# Altium footprint library Pcb.PcbLib: 33 footprints (part 1 of 3)
Each footprint in its own frame and in the unit in brackets; x right, y up, seen from the top. Pads: shape width x height; smd on the part's side, far side on the other; paste and mask are expansions set on the pad; w line width, h text height; cw(c..) or ccw(c..) is an arc to the next point about the centre after c.
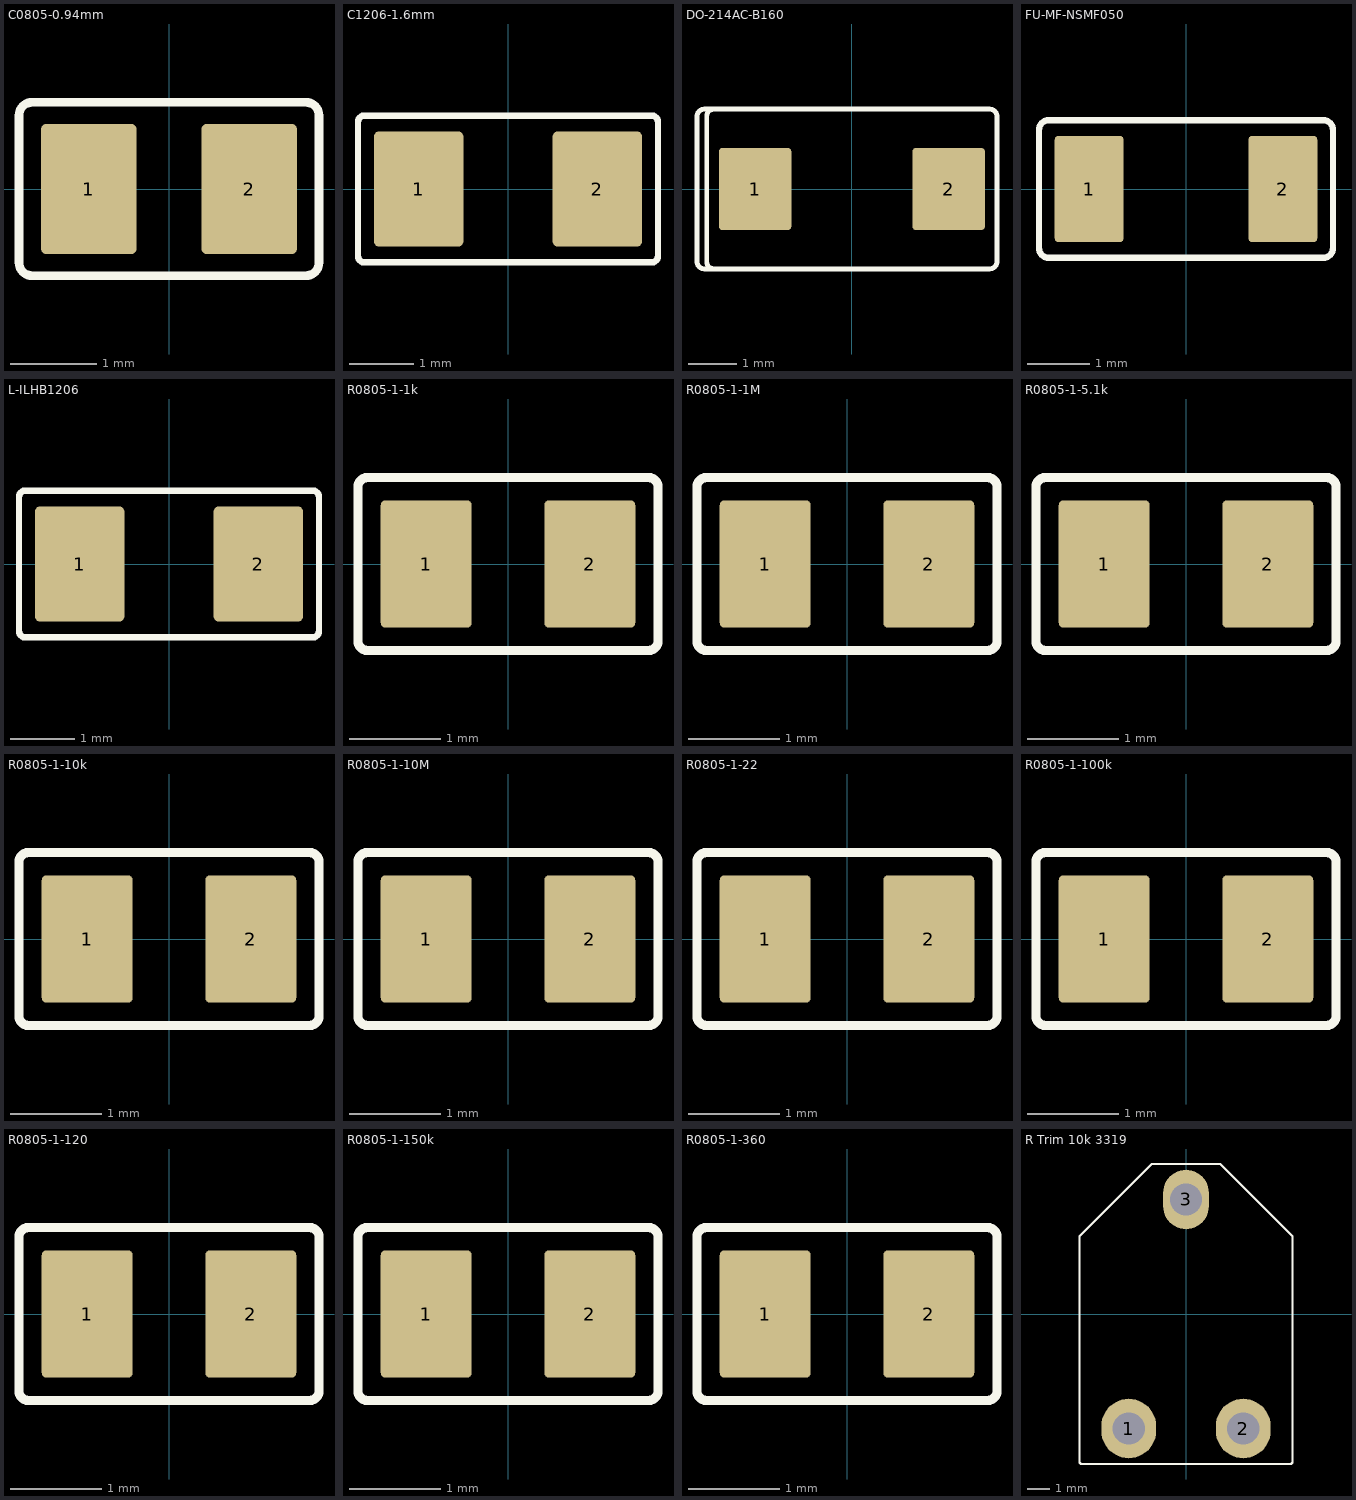
[diagram p0: the footprints below, top view; thin cyan lines are the x and y axes]

## C0805-0.94mm [mm] "Chip Capacitor, IPC Medium Density"
height 0.94
pads (2):
  rrect10% 1.1x1.5 smd: 1(-0.925,0) 2(0.925,0)
Top Overlay:
  lines w0.1: -1.73,-0.85 ccw(c-1.58,-0.85) -1.58,-1 1.58,-1 ccw(c1.58,-0.85) 1.73,-0.85 1.73,0.85 ccw(c1.58,0.85) 1.58,1 -1.58,1 ccw(c-1.58,0.85) -1.73,0.85 -1.73,-0.85
3D body "C0805-0.94mm.SLDPRT": height 0.92, standoff -0.02, extent -1,-0.625 1,0.625

## C1206-1.6mm [mm] "Chip Capacitor, IPC Medium Density"
height 1.6
pads (2):
  rrect10% 1.4x1.8 smd: 1(-1.4,0) 2(1.4,0)
Top Overlay:
  lines w0.1: -2.35,-1.05 ccw(c-2.25,-1.05) -2.25,-1.15 2.25,-1.15 ccw(c2.25,-1.05) 2.35,-1.05 2.35,1.05 ccw(c2.25,1.05) 2.25,1.15 -2.25,1.15 ccw(c-2.25,1.05) -2.35,1.05 -2.35,-1.05
3D body "C1206-1.6mm.SLDPRT": height 1.58, standoff -0.02, extent -1.6,-0.8 1.6,0.8

## DO-214AC-B160 [mm] "Molded Diode, IPC Medium Density"
height 2.29
pads (2):
  rrect10% 1.5x1.7 smd: 1(-2,0) 2(2,0)
Top Overlay:
  lines w0.1: -2.85,-1.65 cw(c-2.85,-1.5) -3,-1.5 -3,1.5 cw(c-2.85,1.5) -2.85,1.65 ; -3.2,-1.5 ccw(c-3.05,-1.5) -3.05,-1.65 2.85,-1.65 ccw(c2.85,-1.5) 3,-1.5 3,1.5 ccw(c2.85,1.5) 2.85,1.65 -3.05,1.65 ccw(c-3.05,1.5) -3.2,1.5 -3.2,-1.5
3D body "DO-214AC-B160.STEP": height 2.91, standoff 0, extent -2.8,-1.475 2.8,1.475

## FU-MF-NSMF050 [mm] "Chip Fuse"
height 0.65
pads (2):
  rrect10% 1.1x1.7 smd: 1(-1.55,0) 2(1.55,0)
Top Overlay:
  lines w0.1: -2.35,-0.95 ccw(c-2.2,-0.95) -2.2,-1.1 2.2,-1.1 ccw(c2.2,-0.95) 2.35,-0.95 2.35,0.95 ccw(c2.2,0.95) 2.2,1.1 -2.2,1.1 ccw(c-2.2,0.95) -2.35,0.95 -2.35,-0.95
3D body "FU-MF-NSMF050.SLDPRT": height 0.54, standoff -0.02, extent -1.6,-0.8 1.6,0.8

## L-ILHB1206 [mm] "Chip Ferrite Bead, IPC Medium Density"
height 1.1
pads (2):
  rrect10% 1.4x1.8 smd: 1(-1.4,0) 2(1.4,0)
Top Overlay:
  lines w0.1: -2.35,-1.05 ccw(c-2.25,-1.05) -2.25,-1.15 2.25,-1.15 ccw(c2.25,-1.05) 2.35,-1.05 2.35,1.05 ccw(c2.25,1.05) 2.25,1.15 -2.25,1.15 ccw(c-2.25,1.05) -2.35,1.05 -2.35,-1.05
3D body "L-ILHB1206.SLDPRT": height 1.08, standoff -0.02, extent -1.6,-0.8 1.6,0.8

## R0805-1-1k [mm] "Yageo general purpose chip resistor, IPC Medium Density"
height 0.6
pads (2):
  rrect10% 1x1.4 smd: 1(-0.9,0) 2(0.9,0)
Top Overlay:
  lines w0.1: -1.65,-0.85 ccw(c-1.55,-0.85) -1.55,-0.95 1.55,-0.95 ccw(c1.55,-0.85) 1.65,-0.85 1.65,0.85 ccw(c1.55,0.85) 1.55,0.95 -1.55,0.95 ccw(c-1.55,0.85) -1.65,0.85 -1.65,-0.85
Mechanical 1:
  lines w0.01: -1,-0.5 -1,-0.625 -0.875,-0.625 ; -1,0.5 -1,0.625 -0.875,0.625 ; 0.875,-0.625 1,-0.625 1,-0.5 ; 0.875,0.625 1,0.625 1,0.5
3D body "R0805-1-1k.SLDPRT": height 0.49, standoff -0.03, extent -1,-0.625 1,0.625

## R0805-1-1M [mm] "Yageo general purpose chip resistor, IPC Medium Density"
height 0.6
pads (2):
  rrect10% 1x1.4 smd: 1(-0.9,0) 2(0.9,0)
Top Overlay:
  lines w0.1: -1.65,-0.85 ccw(c-1.55,-0.85) -1.55,-0.95 1.55,-0.95 ccw(c1.55,-0.85) 1.65,-0.85 1.65,0.85 ccw(c1.55,0.85) 1.55,0.95 -1.55,0.95 ccw(c-1.55,0.85) -1.65,0.85 -1.65,-0.85
Mechanical 1:
  lines w0.01: -1,-0.5 -1,-0.625 -0.875,-0.625 ; -1,0.5 -1,0.625 -0.875,0.625 ; 0.875,-0.625 1,-0.625 1,-0.5 ; 0.875,0.625 1,0.625 1,0.5
3D body "R0805-1-1M.SLDPRT": height 0.49, standoff -0.03, extent -1,-0.625 1,0.625

## R0805-1-5.1k [mm] "Yageo general purpose chip resistor, IPC Medium Density"
height 0.6
pads (2):
  rrect10% 1x1.4 smd: 1(-0.9,0) 2(0.9,0)
Top Overlay:
  lines w0.1: -1.65,-0.85 ccw(c-1.55,-0.85) -1.55,-0.95 1.55,-0.95 ccw(c1.55,-0.85) 1.65,-0.85 1.65,0.85 ccw(c1.55,0.85) 1.55,0.95 -1.55,0.95 ccw(c-1.55,0.85) -1.65,0.85 -1.65,-0.85
Mechanical 1:
  lines w0.01: -1,-0.5 -1,-0.625 -0.875,-0.625 ; -1,0.5 -1,0.625 -0.875,0.625 ; 0.875,-0.625 1,-0.625 1,-0.5 ; 0.875,0.625 1,0.625 1,0.5
3D body "R0805-1-5.1k.SLDPRT": height 0.49, standoff -0.03, extent -1,-0.625 1,0.625

## R0805-1-10k [mm] "Yageo general purpose chip resistor, IPC Medium Density"
height 0.6
pads (2):
  rrect10% 1x1.4 smd: 1(-0.9,0) 2(0.9,0)
Top Overlay:
  lines w0.1: -1.65,-0.85 ccw(c-1.55,-0.85) -1.55,-0.95 1.55,-0.95 ccw(c1.55,-0.85) 1.65,-0.85 1.65,0.85 ccw(c1.55,0.85) 1.55,0.95 -1.55,0.95 ccw(c-1.55,0.85) -1.65,0.85 -1.65,-0.85
Mechanical 1:
  lines w0.01: -1,-0.5 -1,-0.625 -0.875,-0.625 ; -1,0.5 -1,0.625 -0.875,0.625 ; 0.875,-0.625 1,-0.625 1,-0.5 ; 0.875,0.625 1,0.625 1,0.5
3D body "R0805-1-10k.SLDPRT": height 0.49, standoff -0.03, extent -1,-0.625 1,0.625

## R0805-1-10M [mm] "Yageo general purpose chip resistor, IPC Medium Density"
height 0.6
pads (2):
  rrect10% 1x1.4 smd: 1(-0.9,0) 2(0.9,0)
Top Overlay:
  lines w0.1: -1.65,-0.85 ccw(c-1.55,-0.85) -1.55,-0.95 1.55,-0.95 ccw(c1.55,-0.85) 1.65,-0.85 1.65,0.85 ccw(c1.55,0.85) 1.55,0.95 -1.55,0.95 ccw(c-1.55,0.85) -1.65,0.85 -1.65,-0.85
Mechanical 1:
  lines w0.01: -1,-0.5 -1,-0.625 -0.875,-0.625 ; -1,0.5 -1,0.625 -0.875,0.625 ; 0.875,-0.625 1,-0.625 1,-0.5 ; 0.875,0.625 1,0.625 1,0.5
3D body "R0805-1-10M.SLDPRT": height 0.49, standoff -0.03, extent -1,-0.625 1,0.625

## R0805-1-22 [mm] "Yageo general purpose chip resistor, IPC Medium Density"
height 0.6
pads (2):
  rrect10% 1x1.4 smd: 1(-0.9,0) 2(0.9,0)
Top Overlay:
  lines w0.1: -1.65,-0.85 ccw(c-1.55,-0.85) -1.55,-0.95 1.55,-0.95 ccw(c1.55,-0.85) 1.65,-0.85 1.65,0.85 ccw(c1.55,0.85) 1.55,0.95 -1.55,0.95 ccw(c-1.55,0.85) -1.65,0.85 -1.65,-0.85
Mechanical 1:
  lines w0.01: -1,-0.5 -1,-0.625 -0.875,-0.625 ; -1,0.5 -1,0.625 -0.875,0.625 ; 0.875,-0.625 1,-0.625 1,-0.5 ; 0.875,0.625 1,0.625 1,0.5
3D body "R0805-1-22.SLDPRT": height 0.49, standoff -0.03, extent -1,-0.625 1,0.625

## R0805-1-100k [mm] "Yageo general purpose chip resistor, IPC Medium Density"
height 0.6
pads (2):
  rrect10% 1x1.4 smd: 1(-0.9,0) 2(0.9,0)
Top Overlay:
  lines w0.1: -1.65,-0.85 ccw(c-1.55,-0.85) -1.55,-0.95 1.55,-0.95 ccw(c1.55,-0.85) 1.65,-0.85 1.65,0.85 ccw(c1.55,0.85) 1.55,0.95 -1.55,0.95 ccw(c-1.55,0.85) -1.65,0.85 -1.65,-0.85
Mechanical 1:
  lines w0.01: -1,-0.5 -1,-0.625 -0.875,-0.625 ; -1,0.5 -1,0.625 -0.875,0.625 ; 0.875,-0.625 1,-0.625 1,-0.5 ; 0.875,0.625 1,0.625 1,0.5
3D body "R0805-1-100k.SLDPRT": height 0.49, standoff -0.03, extent -1,-0.625 1,0.625

## R0805-1-120 [mm] "Yageo general purpose chip resistor, IPC Medium Density"
height 0.6
pads (2):
  rrect10% 1x1.4 smd: 1(-0.9,0) 2(0.9,0)
Top Overlay:
  lines w0.1: -1.65,-0.85 ccw(c-1.55,-0.85) -1.55,-0.95 1.55,-0.95 ccw(c1.55,-0.85) 1.65,-0.85 1.65,0.85 ccw(c1.55,0.85) 1.55,0.95 -1.55,0.95 ccw(c-1.55,0.85) -1.65,0.85 -1.65,-0.85
Mechanical 1:
  lines w0.01: -1,-0.5 -1,-0.625 -0.875,-0.625 ; -1,0.5 -1,0.625 -0.875,0.625 ; 0.875,-0.625 1,-0.625 1,-0.5 ; 0.875,0.625 1,0.625 1,0.5
3D body "R0805-1-120.SLDPRT": height 0.49, standoff -0.03, extent -1,-0.625 1,0.625

## R0805-1-150k [mm] "Yageo general purpose chip resistor, IPC Medium Density"
height 0.6
pads (2):
  rrect10% 1x1.4 smd: 1(-0.9,0) 2(0.9,0)
Top Overlay:
  lines w0.1: -1.65,-0.85 ccw(c-1.55,-0.85) -1.55,-0.95 1.55,-0.95 ccw(c1.55,-0.85) 1.65,-0.85 1.65,0.85 ccw(c1.55,0.85) 1.55,0.95 -1.55,0.95 ccw(c-1.55,0.85) -1.65,0.85 -1.65,-0.85
Mechanical 1:
  lines w0.01: -1,-0.5 -1,-0.625 -0.875,-0.625 ; -1,0.5 -1,0.625 -0.875,0.625 ; 0.875,-0.625 1,-0.625 1,-0.5 ; 0.875,0.625 1,0.625 1,0.5
3D body "R0805-1-150k.SLDPRT": height 0.49, standoff -0.03, extent -1,-0.625 1,0.625

## R0805-1-360 [mm] "Yageo general purpose chip resistor, IPC Medium Density"
height 0.6
pads (2):
  rrect10% 1x1.4 smd: 1(-0.9,0) 2(0.9,0)
Top Overlay:
  lines w0.1: -1.65,-0.85 ccw(c-1.55,-0.85) -1.55,-0.95 1.55,-0.95 ccw(c1.55,-0.85) 1.65,-0.85 1.65,0.85 ccw(c1.55,0.85) 1.55,0.95 -1.55,0.95 ccw(c-1.55,0.85) -1.65,0.85 -1.65,-0.85
Mechanical 1:
  lines w0.01: -1,-0.5 -1,-0.625 -0.875,-0.625 ; -1,0.5 -1,0.625 -0.875,0.625 ; 0.875,-0.625 1,-0.625 1,-0.5 ; 0.875,0.625 1,0.625 1,0.5
3D body "R0805-1-360.SLDPRT": height 0.49, standoff -0.03, extent -1,-0.625 1,0.625

## R Trim 10k 3319 [mm]
height 6.86
pads (3):
  oval 2.4x2.6 hole 1.4: 1(-2.5,-5) 2(2.5,-5)
  oval 2x2.6 hole 1.4: 3(0,5)
Top Overlay:
  lines w0.1: -4.65,-6.45 ccw(c-4.55,-6.45) -4.55,-6.55 4.55,-6.55 ccw(c4.55,-6.45) 4.65,-6.45 4.65,3.4 1.5,6.55 -1.5,6.55 -4.65,3.4 -4.65,-6.45
3D body "3319P.SLDPRT": height 6.35, standoff -4, extent -4.496,-5.994 4.496,5.359